# Altium footprint library mastermind.PCBLIB: 1061 footprints (part 51 of 67)
Each footprint in its own frame and in the unit in brackets; x right, y up, seen from the top. Pads: shape width x height; smd on the part's side, far side on the other; paste and mask are expansions set on the pad; w line width, h text height; cw(c..) or ccw(c..) is an arc to the next point about the centre after c.
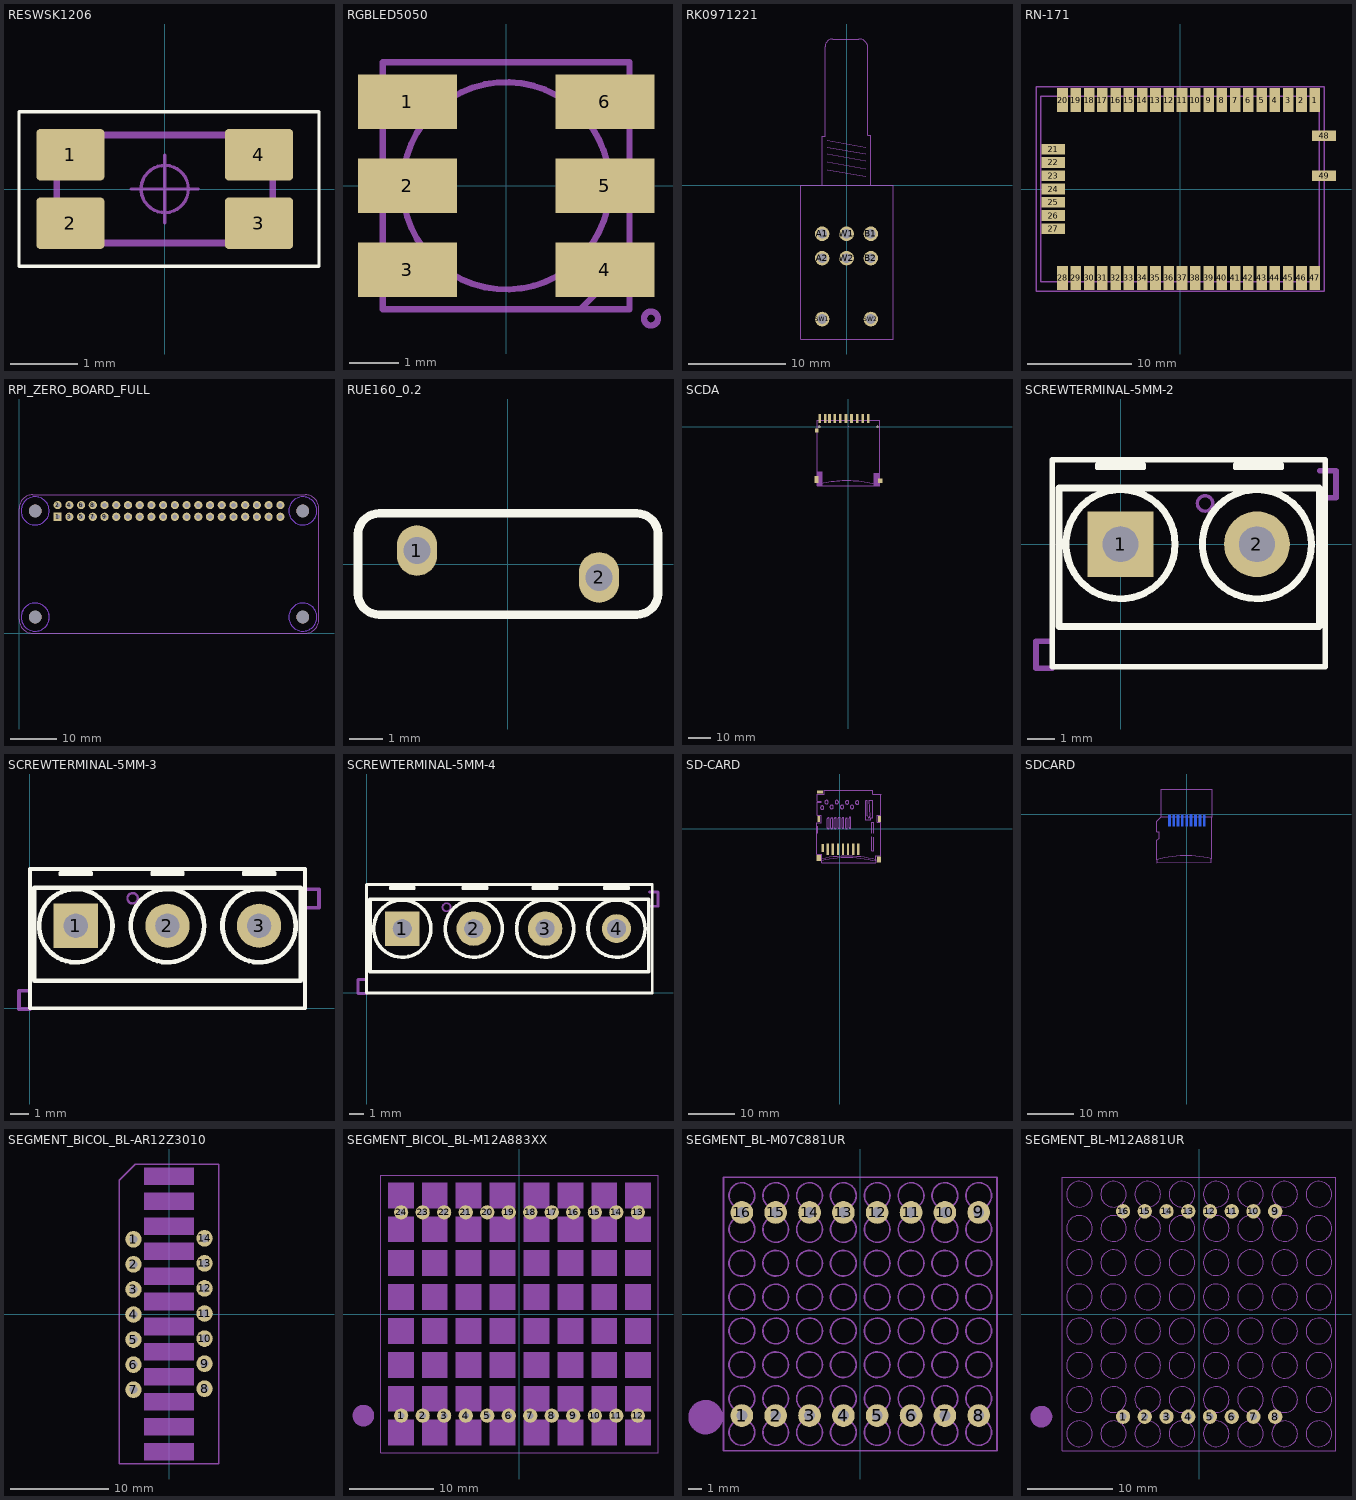
[diagram p50: the footprints below, top view; thin cyan lines are the x and y axes]

## RESWSK1206 [mil]
pads (4):
  rrect15% 39.76x30 smd: 1(-55,20) 2(-55,-20) 3(55,-20) 4(55,20)
Top Overlay:
  lines w1.97: -85,-45 90,-45 90,45 -85,45 -85,-45
Top Component Center:
  circle w1.97: c0,0 r13.78
  lines w1.97: -19.68,0 19.68,0 ; 0,-19.68 0,19.68
Top 3D Body:
  lines w0.04: -62.98,-31.49 63,-31.49 63,31.51 -62.98,31.51 -62.98,-31.49
Top Dimensions:
  lines w3.94: -62.99,-31.5 62.99,-31.5 62.99,31.5 -62.99,31.5 -62.99,-31.5
Top Assembly:
  text ".Designator" at -59.06,56.1 h29.53
3D body "WSK1206.stp": height 25, standoff 0, extent -62.98,-31.49 63,31.51

## RGBLED5050 [mm]
pads (6):
  rect 2x1.1 smd: 1(-2,1.7) 2(-2,0) 3(-2,-1.7) 4(2,-1.7) 5(2,0) 6(2,1.7)
Mechanical 2:
  circle w0.127: c2.934,-2.688 r0.141
  circle w0.127: c0,0 r2.1
  lines w0.127: 1.5,-2.5 2.5,-2.5 2.5,-1.5 ; 1.5,-2.5 -2.5,-2.5 -2.5,2.5 2.5,2.5 2.5,-1.5 ; 1.5,-2.5 2.5,-1.5

## RK0971221 [mm]
pads (8):
  round 1.5 hole 1: A1(-2.5,-5) A2(-2.5,-7.5) B1(2.5,-5) B2(2.5,-7.5) SW1(-2.5,-13.75) SW2(2.5,-13.75) W1(0,-5) W2(0,-7.5)
Mechanical 2:
  lines w0.127: -2,1.6 2,0.9 ; -2,2.4 2,1.7 ; -2,3.2 2,2.5 ; -2,3.9 2,3.2 ; -2,4.6 2,3.9 ; -2.5,0 2.5,0 ; -2.5,0 -4.7,0 -4.7,-15.8 4.8,-15.8 4.8,0 2.5,0 ; -2.5,0 -2.5,5 -2.2,5 -2.2,14.219 cw(c-1.419,14.219) -1.419,15 1.278,15 cw(c1.278,14.078) 2.2,14.078 2.2,5.1 2.5,5.1 2.5,0

## RN-171 [mil]
pads (49):
  rect 40x90 smd: 1(507.5,335) 2(457.5,335) 3(407.5,335) 4(357.5,335) 5(307.5,335) 6(257.5,335) 7(207.5,335) 8(157.5,335) 9(107.5,335) 10(57.5,335) 11(7.5,335) 12(-42.5,335) 13(-92.5,335) 14(-142.5,335) 15(-192.5,335) 16(-242.5,335) 17(-292.5,335) 18(-342.5,335) 19(-392.5,335) 20(-442.5,335) 28(-442.5,-335) 29(-392.5,-335) 30(-342.5,-335) 31(-292.5,-335) 32(-242.5,-335) 33(-192.5,-335) 34(-142.5,-335) 35(-92.5,-335) 36(-42.5,-335) 37(7.5,-335) 38(57.5,-335) 39(107.5,-335) 40(157.5,-335) 41(207.5,-335) 42(257.5,-335) 43(307.5,-335) 44(357.5,-335) 45(407.5,-335) 46(457.5,-335) 47(507.5,-335)
  rect 90x40 smd: 21(-477.5,150) 22(-477.5,100) 23(-477.5,50) 24(-477.5,0) 25(-477.5,-50) 26(-477.5,-100) 27(-477.5,-150) 48(542.5,200) 49(542.5,50)
Mechanical 2:
  lines w5: -542.5,-385 -542.5,385 542.5,385 542.5,-385 -542.5,-385 ; -525,-350 -525,350 525,350 525,-350 -525,-350

## RPI_ZERO_BOARD_FULL [mil]
pads (44):
  rect 70x70 / inner rect 60x60 / far side rect 70x70 hole 39.37: 1(329.53,993.31)
  round 70 / inner round 60 / far side round 70 hole 39.37: 2(329.53,1093.31) 3(429.53,993.31) 4(429.53,1093.31) 5(529.53,993.31) 6(529.53,1093.31) 7(629.53,993.31) 8(629.53,1093.31) 9(729.53,993.31) 10(729.53,1093.31) 11(829.53,993.31) 12(829.53,1093.31) 13(929.53,993.31) 14(929.53,1093.31) 15(1029.53,993.31) 16(1029.53,1093.31) 17(1129.53,993.31) 18(1129.53,1093.31) 19(1229.53,993.31) 20(1229.53,1093.31) 21(1329.53,993.31) 22(1329.53,1093.31) 23(1429.53,993.31) 24(1429.53,1093.31) 25(1529.53,993.31) 26(1529.53,1093.31) 27(1629.53,993.31) 28(1629.53,1093.31) 29(1729.53,993.31) 30(1729.53,1093.31) 31(1829.53,993.31) 32(1829.53,1093.31) 33(1929.53,993.31) 34(1929.53,1093.31) 35(2029.53,993.31) 36(2029.53,1093.31) 37(2129.53,993.31) 38(2129.53,1093.31) 39(2229.53,993.31) 40(2229.53,1093.31)
  round 108.27 hole 108.27 unplated: MH1(137.8,137.8) MH2(137.8,1043.31) MH3(2421.26,137.8) MH4(2421.26,1043.31)
Top Layer keep-out:
  circle w0.04: c137.8,1043.31 r120.08
  circle w0.04: c2421.26,1043.31 r120.08
  circle w0.04: c2421.26,137.8 r120.08
  circle w0.04: c137.8,137.8 r120.08
Bottom Layer keep-out:
  circle w0.04: c137.8,1043.31 r120.08
  circle w0.04: c138.36,137.4 r120.08
  circle w0.04: c2421.26,137.8 r120.08
  circle w0.04: c2421.26,1043.31 r120.08
Bottom Overlay:
  lines w5: 279.53,1043.31 279.53,943.31 317.03,943.31 ; 279.53,1043.31 379.53,1043.31 379.53,943.31 ; 279.53,1043.31 279.53,1143.31 2279.53,1143.31 2279.53,943.31 379.53,943.31 ; 317.03,943.31 342.03,943.31 ; 317.03,943.31 317.03,930.81 342.03,930.81 342.03,943.31 ; 342.03,943.31 379.53,943.31
Top Solder:
  circle w78.74: c137.8,137.8 r82.17
  circle w78.74: c2421.26,137.8 r82.17
  circle w78.74: c2421.26,1043.31 r82.17
  circle w78.74: c137.8,1043.31 r82.17
Bottom Solder:
  circle w78.74: c137.8,137.8 r82.17
  circle w78.74: c2421.26,137.8 r82.17
  circle w78.74: c2421.26,1043.31 r82.17
  circle w78.74: c137.8,1043.31 r82.17
Mechanical 4:
  lines w10: 1452.76,0 1486.22,0 1781.5,0 ; 1948.82,0 1982.28,0 2277.56,0
Dimensions:
  lines w10: 0,118.11 ccw(c118.11,118.11) 118.11,0 269.69,0 564.96,0 2440.94,0 ccw(c2440.95,118.11) 2559.06,118.11 2559.06,1062.99 ccw(c2440.95,1062.98) 2440.94,1181.1 118.11,1181.1 ccw(c118.11,1062.99) 0,1062.99 0,118.11
Mechanical 8:
  lines w10: 0,118.11 ccw(c118.11,118.11) 118.11,0 269.69,0 564.96,0 2440.94,0 ccw(c2440.95,118.11) 2559.06,118.11 2559.06,1062.99 ccw(c2440.95,1062.98) 2440.94,1181.1 118.11,1181.1 ccw(c118.11,1062.99) 0,1062.99 0,118.11

## RUE160_0.2 [mm]
pads (2):
  oval 1.2x1.5 hole 0.8: 1(-2.7,0.4) 2(2.7,-0.4)
Top Overlay:
  lines w0.254: -4.45,-0.889 ccw(c-3.827,-0.877) -3.815,-1.5 3.815,-1.5 ccw(c3.827,-0.877) 4.45,-0.889 4.45,0.889 ccw(c3.827,0.877) 3.815,1.5 -3.815,1.5 ccw(c-3.827,0.877) -4.45,0.889 -4.45,-0.889
3D body: height 12, standoff 0, extent -4.451,-1.503 4.451,1.503

## SCDA [mm]
pads (15):
  round 1 hole 1: 1(-13,0) 1(13,0)
  rect 1.2x4 smd: 1(6.4,3.7) 2(3.9,3.7) 3(1.4,3.7) 4(-1.1,3.7) 5(-3.6,3.7) 6(-6.1,3.7) 7(-8.4,3.7) 8(-10.4,3.7) 9(8.9,3.7) 10(-12.8,3.7)
  rect 1.7x1.8 smd: 11(-14.1,-1.7)
  rect 1.7x3.1 smd: 12(-14.2,-23.5)
  rect 1.9x1.9 smd: 13(14.2,-24.1)
Mechanical 2:
  lines w0.127: -12.4,-26.3 -12.4,-25.5 cw(c-0.615,-76.23) 12,-25.7 12,-26.3 ; -12.4,-26.3 -14,-26.3 -14,2.8 14.1,2.8 14.1,-26.3 12,-26.3 ; -12.4,-26.3 12,-26.3
Mechanical 29 (Mech34):
  region: 0,0 0.254,0 0.254,0.254 0,0.254
  region: 11.3,-26.3 11.3,-20.8 14.1,-20.8 14.1,-26.3
  region: -14,-26.3 -14,-20.2 -11.7,-20.2 -11.7,-26.3

## SCREWTERMINAL-5MM-2 [mil]
pads (2):
  rect 95x95 hole 51.18 slot 51.38 at 0 deg paste-99999 mask+2: 1(0,0)
  round 95 hole 51.18 slot 51.38 at 0 deg paste-99999 mask+2: 2(196.85,0)
Top Overlay:
  circle w10: c0,0 r78.74
  circle w10: c196.85,0 r78.74
  lines w5.98: -33.93,115.12 -33.93,110.12 33.93,110.12 33.93,115.2 -33.26,115.2 ; 165.44,115.12 165.44,110.12 233.29,110.12 233.29,115.2 166.11,115.2
  lines w8: -98.43,-177.17 -98.43,122.05 295.28,122.05 295.28,-177.17 -98.43,-177.17
  lines w10: -89.1,-118.6 286.85,-118.6 286.85,81.4 -89.1,81.4 -89.1,-118.6
Mechanical 15:
  lines w5: 133.18,58.8 cw(c122.06,58.93) 133.18,59.05
  lines w8: -98.43,-179.14 -122.05,-179.14 -122.05,-139.77 -98.43,-139.77 ; 287.4,66.93 311.02,66.93 311.02,106.3 287.4,106.3
3D body "ScrewTerminal.STEP": height 449.31, standoff -121.56, extent -104.11,-177.17 300.96,122.05

## SCREWTERMINAL-5MM-3 [mm]
pads (3):
  rect 2.413x2.413 hole 1.3 slot 1.305 at 0 deg paste-2539.97 mask+0.051: 1(2.5,4.5)
  round 2.413 hole 1.3 slot 1.305 at 0 deg paste-2539.97 mask+0.051: 2(7.5,4.5) 3(12.5,4.5)
Top Overlay:
  circle w0.254: c2.5,4.5 r2
  circle w0.254: c7.5,4.5 r2
  circle w0.254: c12.5,4.5 r2
  lines w0.152: 1.639,7.408 1.639,7.281 3.363,7.281 3.363,7.41 1.656,7.41 ; 6.638,7.408 6.638,7.281 8.362,7.281 8.362,7.41 6.655,7.41 ; 11.638,7.408 11.638,7.281 13.362,7.281 13.362,7.41 11.655,7.41
  lines w0.203: 0,0 0,7.6 15,7.6 15,0 0,0
  lines w0.254: 0.237,1.488 14.774,1.488 14.774,6.568 0.237,6.568 0.237,1.488
Mechanical 15:
  lines w0.127: 5.883,5.994 cw(c5.6,5.997) 5.883,6
  lines w0.203: 0,-0.05 -0.6,-0.05 -0.6,0.95 0,0.95 ; 15.17,5.485 15.769,5.485 15.769,6.485 15.17,6.485

## SCREWTERMINAL-5MM-4 [mm]
pads (4):
  rect 2.413x2.413 hole 1.3 slot 1.305 at 0 deg paste-2539.97 mask+0.051: 1(2.5,4.5)
  round 2.413 hole 1.3 slot 1.305 at 0 deg paste-2539.97 mask+0.051: 2(7.5,4.5) 3(12.5,4.5)
  round 2.032 hole 1.3 slot 1.305 at 0 deg paste-2539.97 mask+0.051: 4(17.5,4.5)
Top Overlay:
  circle w0.254: c2.5,4.5 r2
  circle w0.254: c7.5,4.5 r2
  circle w0.254: c12.5,4.5 r2
  circle w0.254: c17.5,4.5 r2
  lines w0.152: 1.638,7.413 1.638,7.287 3.362,7.287 3.362,7.416 1.655,7.416 ; 6.726,7.413 6.726,7.287 8.45,7.287 8.45,7.416 6.743,7.416 ; 11.638,7.413 11.638,7.287 13.362,7.287 13.362,7.416 11.655,7.416 ; 16.638,7.413 16.638,7.287 18.362,7.287 18.362,7.416 16.655,7.416
  lines w0.203: 0,0 0,7.6 20,7.6 20,0 0,0
  lines w0.254: 0.237,1.488 19.762,1.488 19.762,6.568 0.237,6.568 0.237,1.488
Mechanical 15:
  lines w0.127: 5.883,5.994 cw(c5.6,5.997) 5.883,6
  lines w0.203: 0,-0.05 -0.6,-0.05 -0.6,0.95 0,0.95 ; 19.8,6.068 20.4,6.068 20.4,7.068 19.8,7.068

## SD-CARD [mm]
pads (13):
  rect 0.5x2.5 smd: 1(4.047,-4.35) 2(2.942,-4.35) 3(1.841,-4.35) 4(0.743,-4.35) 5(-0.349,-4.35) 6(-1.448,-4.35) 7(-2.548,-4.35)
  rect 0.5x1.8 smd: 8(-3.651,-4.1)
  rect 1.27x0.635 smd: GND1(-4.2,8)
  rect 0.635x1.27 smd: GND2(8.61,2.18) GND3(-4.495,2.18)
  rect 0.9x1.27 smd: GND4(-4.495,-6.3) GND5(8.51,-6.62)
Mechanical 2:
  circle w0.127: c-3.75,4.6 r0.381
  circle w0.127: c2.7,4.75 r0.381
  circle w0.127: c0.55,4.75 r0.381
  circle w0.127: c-1.7,4.75 r0.381
  circle w0.127: c3.8,5.7 r0.381
  circle w0.127: c1.65,5.75 r0.381
  circle w0.127: c-0.6,5.8 r0.381
  circle w0.127: c-2.8,5.8 r0.381
  lines w0.127: -4.914,0.597 -4.73,0.597 -4.73,-0.798 -4.878,-0.798 -4.878,-0.783 ; -4.912,-5.503 -4.92,-5.505 ; -4.825,6.35 -4.825,7.5 -3.35,7.5 -3.35,8.35 ; -4.81,6.345 -4.822,6.345 -4.822,6 -3.945,6 -3.945,5.76 -4.837,5.76 -4.837,2.985 -3.99,2.985 -3.99,1.365 -4.92,1.365 -4.92,-5.505 ; -3.857,-6.832 cw(c1.606,-31.218) 7.85,-7.02 ; -3.855,-6.6 -3.855,-5.505 -4.92,-5.505 ; -3.847,-6.836 -3.834,-6.822 ; -3.845,-7.275 7.854,-7.275 7.854,-7.277 ; -3.846,-7.256 -3.855,-7.258 -3.855,-6.48 cw(c1.609,-30.886) 7.861,-6.67 7.865,-7.266 ; -3.845,-6.52 -3.845,-6.492 ; -3.3,8.4 -1.55,8.4 ; -2.65,0.2 -2.65,0.25 ; -1.9,0.2 -1.9,0.25 ; -1.537,8.406 -1.537,8.397 0.13,8.397 0.13,8.38 2.285,8.38 2.285,8.385 6.187,8.385 6.187,8.38 ; -1.1,0.2 -1.1,0.25 ; -0.25,0.25 -0.25,0.3 ; 0.55,0.25 0.55,0.3 ; 1.3,0.15 1.3,0.2 ; 2.05,0.3 2.05,0.35 ; 5.587,6.138 5.597,1.985 6.707,1.985 6.707,2.465 7.202,2.465 7.202,6.183 6.347,6.183 6.495,2.768 cw(c6.26,2.672) 6.228,2.42 6.003,2.885 6.003,6.152 5.643,6.152 ; 6.2,8.39 7.16,8.39 7.16,7.478 ; 6.99,-1.738 6.99,-4.665 7.35,-4.665 7.35,-1.763 ; 7.005,-0.885 7.005,1.44 7.395,1.44 7.395,-0.885 ; 7.21,7.457 8.905,7.457 8.905,7.44 ; 7.86,-6.765 7.86,-5.79 8.92,-5.79 ; 8.9,7.475 8.925,7.4 8.925,2.95 8.1,2.95 8.1,1.425 8.925,1.425 8.925,1.4 ; 8.925,-5.8 8.925,1.375 8.95,1.375 ; -2.65,0.25 ccw(c-2.475,0.225) -2.5,0.05 -2.45,0.05 ccw(c-2.425,0.225) -2.25,0.2 -2.25,2.25 ccw(c-2.4,2.25) -2.4,2.4 -2.5,2.4 ccw(c-2.5,2.25) -2.65,2.25 -2.65,0.25 ; -1.9,0.25 ccw(c-1.725,0.225) -1.75,0.05 -1.7,0.05 ccw(c-1.675,0.225) -1.5,0.2 -1.5,2.25 ccw(c-1.65,2.25) -1.65,2.4 -1.75,2.4 ccw(c-1.75,2.25) -1.9,2.25 -1.9,0.25 ; -1.1,0.25 ccw(c-0.925,0.225) -0.95,0.05 -0.9,0.05 ccw(c-0.875,0.225) -0.7,0.2 -0.7,2.25 ccw(c-0.85,2.25) -0.85,2.4 -0.95,2.4 ccw(c-0.95,2.25) -1.1,2.25 -1.1,0.25 ; -0.25,0.3 ccw(c-0.075,0.275) -0.1,0.1 -0.05,0.1 ccw(c-0.025,0.275) 0.15,0.25 0.15,2.3 ccw(c0,2.3) 0,2.45 -0.1,2.45 ccw(c-0.1,2.3) -0.25,2.3 -0.25,0.3 ; 0.55,0.3 ccw(c0.725,0.275) 0.7,0.1 0.75,0.1 ccw(c0.775,0.275) 0.95,0.25 0.95,2.3 ccw(c0.8,2.3) 0.8,2.45 0.7,2.45 ccw(c0.7,2.3) 0.55,2.3 0.55,0.3 ; 1.3,0.2 ccw(c1.475,0.175) 1.45,0 1.5,0 ccw(c1.525,0.175) 1.7,0.15 1.7,2.2 ccw(c1.55,2.2) 1.55,2.35 1.45,2.35 ccw(c1.45,2.2) 1.3,2.2 1.3,0.2 ; 2.05,0.35 ccw(c2.225,0.325) 2.2,0.15 2.25,0.15 ccw(c2.275,0.325) 2.45,0.3 2.45,2.35 ccw(c2.3,2.35) 2.3,2.5 2.2,2.5 ccw(c2.2,2.35) 2.05,2.35 2.05,0.35

## SDCARD [mm]
pads (9):
  rect 0.5x2.5 smd far side: 1(-2.752,-1.325) 2(-1.817,-1.325) 3(-0.931,-1.338) 4(0.042,-1.351) 5(0.979,-1.313) 6(1.908,-1.336) 7(2.868,-1.323) 8(3.801,-1.323) 9(-3.688,-1.325)
Mechanical 3:
  lines w0.127: -6.395,-9.76 -6.395,-5.63 -5.9,-5.135 -5.9,-3.78 -6.395,-3.78 -6.395,-1.515 -6.4,-1.51 -5.46,-0.57 -5.405,-0.57 ; 5.365,-0.57 5.365,-9.6 5.38,-9.6 ; -6.395,-9.75 cw(c-0.126,-34.036) 5.355,-9.56 5.355,-10.36 5.335,-10.36 -6.38,-10.41 -6.395,-9.75 ; -5.447,-0.579 5.553,-0.579 5.553,5.421 -5.447,5.421 -5.447,-0.579

## SEGMENT_BICOL_BL-AR12Z3010 [mil]
pads (14):
  round 66 hole 31.5: 1(-141.73,298.03) 2(-141.73,198.03) 3(-141.73,98.03) 4(-141.73,-1.97) 5(-141.73,-101.97) 6(-141.73,-201.97) 7(-141.73,-301.97) 8(141.73,-298.03) 9(141.73,-198.03) 10(141.73,-98.03) 11(141.73,1.97) 12(141.73,101.97) 13(141.73,201.97) 14(141.73,301.97)
Mechanical 2:
  lines w5: -198.82,-598.43 198.82,-598.43 198.82,598.43 -134.06,598.43 -198.82,534.45 -198.82,-598.43
Mechanical 8:
  region: -98.43,15.75 -98.43,84.25 98.43,84.25 98.43,15.75
  region: -98.43,115.75 -98.43,184.25 98.43,184.25 98.43,115.75
  region: -98.43,215.75 -98.43,284.25 98.43,284.25 98.43,215.75
  region: -98.43,315.75 -98.43,384.25 98.43,384.25 98.43,315.75
  region: -98.43,415.75 -98.43,484.25 98.43,484.25 98.43,415.75
  region: -98.43,515.75 -98.43,584.25 98.43,584.25 98.43,515.75
  region: -98.43,-84.25 -98.43,-15.75 98.43,-15.75 98.43,-84.25
  region: -98.43,-184.25 -98.43,-115.75 98.43,-115.75 98.43,-184.25
  region: -98.43,-284.25 -98.43,-215.75 98.43,-215.75 98.43,-284.25
  region: -98.43,-384.25 -98.43,-315.75 98.43,-315.75 98.43,-384.25
  region: -98.43,-484.25 -98.43,-415.75 98.43,-415.75 98.43,-484.25
  region: -98.43,-584.25 -98.43,-515.75 98.43,-515.75 98.43,-584.25
  lines w5: -198.82,-598.43 198.82,-598.43 198.82,598.43 -134.06,598.43 -198.82,534.45 -198.82,-598.43

## SEGMENT_BICOL_BL-M12A883XX [mil]
pads (24):
  round 66 hole 31.5: 1(-550,-472.44) 2(-450,-472.44) 3(-350,-472.44) 4(-250,-472.44) 5(-150,-472.44) 6(-50,-472.44) 7(50,-472.44) 8(150,-472.44) 9(250,-472.44) 10(350,-472.44) 11(450,-472.44) 12(550,-472.44) 13(550,472.44) 14(450,472.44) 15(350,472.44) 16(250,472.44) 17(150,472.44) 18(50,472.44) 19(-50,472.44) 20(-150,472.44) 21(-250,472.44) 22(-350,472.44) 23(-450,472.44) 24(-550,472.44)
Mechanical 2:
  circle w50: c-725.59,-472.44 r25
  lines w5: -643.7,-643.7 -643.7,643.7 643.7,643.7 643.7,-643.7 -643.7,-643.7
Mechanical 8:
  drawing of 68 lines, arcs and shapes, not listed

## SEGMENT_BL-M07C881UR [mil]
pads (16):
  round 66 hole 31.5: 1(-344.49,-295.28) 2(-246.06,-295.28) 3(-147.64,-295.28) 4(-49.21,-295.28) 5(49.21,-295.28) 6(147.64,-295.28) 7(246.06,-295.28) 8(344.49,-295.28) 9(344.49,295.28) 10(246.06,295.28) 11(147.64,295.28) 12(49.21,295.28) 13(-49.21,295.28) 14(-147.64,295.28) 15(-246.06,295.28) 16(-344.49,295.28)
Mechanical 2:
  circle w50: c-450,-300 r25
  lines w5: -397.64,-397.64 -397.64,397.64 397.64,397.64 397.64,-397.64 -397.64,-397.64
Mechanical 8:
  circle w5: c344.49,-344.49 r37.4
  circle w5: c246.06,-344.49 r37.4
  circle w5: c147.64,-344.49 r37.4
  circle w5: c49.21,-344.49 r37.4
  circle w5: c-49.21,-344.49 r37.4
  circle w5: c-147.64,-344.49 r37.4
  circle w5: c-246.06,-344.49 r37.4
  circle w5: c-344.49,-344.49 r37.4
  circle w5: c344.49,-246.06 r37.4
  circle w5: c246.06,-246.06 r37.4
  circle w5: c147.64,-246.06 r37.4
  circle w5: c49.21,-246.06 r37.4
  circle w5: c-49.21,-246.06 r37.4
  circle w5: c-147.64,-246.06 r37.4
  circle w5: c-246.06,-246.06 r37.4
  circle w5: c-344.49,-246.06 r37.4
  circle w5: c344.49,-147.64 r37.4
  circle w5: c246.06,-147.64 r37.4
  circle w5: c147.64,-147.64 r37.4
  circle w5: c49.21,-147.64 r37.4
  circle w5: c-49.21,-147.64 r37.4
  circle w5: c-147.64,-147.64 r37.4
  circle w5: c-246.06,-147.64 r37.4
  circle w5: c-344.49,-147.64 r37.4
  circle w5: c344.49,-49.21 r37.4
  circle w5: c246.06,-49.21 r37.4
  circle w5: c147.64,-49.21 r37.4
  circle w5: c49.21,-49.21 r37.4
  circle w5: c-49.21,-49.21 r37.4
  circle w5: c-147.64,-49.21 r37.4
  circle w5: c-246.06,-49.21 r37.4
  circle w5: c-344.49,-49.21 r37.4
  circle w5: c344.49,49.21 r37.4
  circle w5: c246.06,49.21 r37.4
  circle w5: c147.64,49.21 r37.4
  circle w5: c49.21,49.21 r37.4
  circle w5: c-49.21,49.21 r37.4
  circle w5: c-147.64,49.21 r37.4
  circle w5: c-246.06,49.21 r37.4
  circle w5: c-344.49,49.21 r37.4
  circle w5: c344.49,147.64 r37.4
  circle w5: c246.06,147.64 r37.4
  circle w5: c147.64,147.64 r37.4
  circle w5: c49.21,147.64 r37.4
  circle w5: c-49.21,147.64 r37.4
  circle w5: c-147.64,147.64 r37.4
  circle w5: c-246.06,147.64 r37.4
  circle w5: c-344.49,147.64 r37.4
  circle w5: c344.49,246.06 r37.4
  circle w5: c246.06,246.06 r37.4
  circle w5: c147.64,246.06 r37.4
  circle w5: c49.21,246.06 r37.4
  circle w5: c-49.21,246.06 r37.4
  circle w5: c-147.64,246.06 r37.4
  circle w5: c-246.06,246.06 r37.4
  circle w5: c-344.49,246.06 r37.4
  circle w5: c344.49,344.49 r37.4
  circle w5: c246.06,344.49 r37.4
  circle w5: c147.64,344.49 r37.4
  circle w5: c49.21,344.49 r37.4
  circle w5: c-49.21,344.49 r37.4
  circle w5: c-147.64,344.49 r37.4
  circle w5: c-246.06,344.49 r37.4
  circle w5: c-344.49,344.49 r37.4
  lines w5: -397.64,-397.64 -397.64,397.64 397.64,397.64 397.64,-397.64 -397.64,-397.64

## SEGMENT_BL-M12A881UR [mil]
pads (16):
  round 66 hole 31.5: 1(-350,-472.44) 2(-250,-472.44) 3(-150,-472.44) 4(-50,-472.44) 5(50,-472.44) 6(150,-472.44) 7(250,-472.44) 8(350,-472.44) 9(350,472.44) 10(250,472.44) 11(150,472.44) 12(50,472.44) 13(-50,472.44) 14(-150,472.44) 15(-250,472.44) 16(-350,472.44)
Mechanical 2:
  circle w50: c-725.59,-472.44 r25
  lines w5: -629.92,-629.92 -629.92,629.92 629.92,629.92 629.92,-629.92 -629.92,-629.92
Mechanical 8:
  circle w5: c551.18,-551.18 r59.06
  circle w5: c393.7,-551.18 r59.06
  circle w5: c236.22,-551.18 r59.06
  circle w5: c78.74,-551.18 r59.06
  circle w5: c-78.74,-551.18 r59.06
  circle w5: c-236.22,-551.18 r59.06
  circle w5: c-393.7,-551.18 r59.06
  circle w5: c-551.18,-551.18 r59.06
  circle w5: c551.18,-393.7 r59.06
  circle w5: c393.7,-393.7 r59.06
  circle w5: c236.22,-393.7 r59.06
  circle w5: c78.74,-393.7 r59.06
  circle w5: c-78.74,-393.7 r59.06
  circle w5: c-236.22,-393.7 r59.06
  circle w5: c-393.7,-393.7 r59.06
  circle w5: c-551.18,-393.7 r59.06
  circle w5: c551.18,-236.22 r59.06
  circle w5: c393.7,-236.22 r59.06
  circle w5: c236.22,-236.22 r59.06
  circle w5: c78.74,-236.22 r59.06
  circle w5: c-78.74,-236.22 r59.06
  circle w5: c-236.22,-236.22 r59.06
  circle w5: c-393.7,-236.22 r59.06
  circle w5: c-551.18,-236.22 r59.06
  circle w5: c551.18,-78.74 r59.06
  circle w5: c393.7,-78.74 r59.06
  circle w5: c236.22,-78.74 r59.06
  circle w5: c78.74,-78.74 r59.06
  circle w5: c-78.74,-78.74 r59.06
  circle w5: c-236.22,-78.74 r59.06
  circle w5: c-393.7,-78.74 r59.06
  circle w5: c-551.18,-78.74 r59.06
  circle w5: c551.18,78.74 r59.06
  circle w5: c393.7,78.74 r59.06
  circle w5: c236.22,78.74 r59.06
  circle w5: c78.74,78.74 r59.06
  circle w5: c-78.74,78.74 r59.06
  circle w5: c-236.22,78.74 r59.06
  circle w5: c-393.7,78.74 r59.06
  circle w5: c-551.18,78.74 r59.06
  circle w5: c551.18,236.22 r59.06
  circle w5: c393.7,236.22 r59.06
  circle w5: c236.22,236.22 r59.06
  circle w5: c78.74,236.22 r59.06
  circle w5: c-78.74,236.22 r59.06
  circle w5: c-236.22,236.22 r59.06
  circle w5: c-393.7,236.22 r59.06
  circle w5: c-551.18,236.22 r59.06
  circle w5: c551.18,393.7 r59.06
  circle w5: c393.7,393.7 r59.06
  circle w5: c236.22,393.7 r59.06
  circle w5: c78.74,393.7 r59.06
  circle w5: c-78.74,393.7 r59.06
  circle w5: c-236.22,393.7 r59.06
  circle w5: c-393.7,393.7 r59.06
  circle w5: c-551.18,393.7 r59.06
  circle w5: c551.18,551.18 r59.06
  circle w5: c393.7,551.18 r59.06
  circle w5: c236.22,551.18 r59.06
  circle w5: c78.74,551.18 r59.06
  circle w5: c-78.74,551.18 r59.06
  circle w5: c-236.22,551.18 r59.06
  circle w5: c-393.7,551.18 r59.06
  circle w5: c-551.18,551.18 r59.06
  lines w5: -629.92,-629.92 -629.92,629.92 629.92,629.92 629.92,-629.92 -629.92,-629.92